# Altium footprint library ASM001-design.PcbLib: 42 footprints (part 1 of 3)
Each footprint in its own frame and in the unit in brackets; x right, y up, seen from the top. Pads: shape width x height; smd on the part's side, far side on the other; paste and mask are expansions set on the pad; w line width, h text height; cw(c..) or ccw(c..) is an arc to the next point about the centre after c.
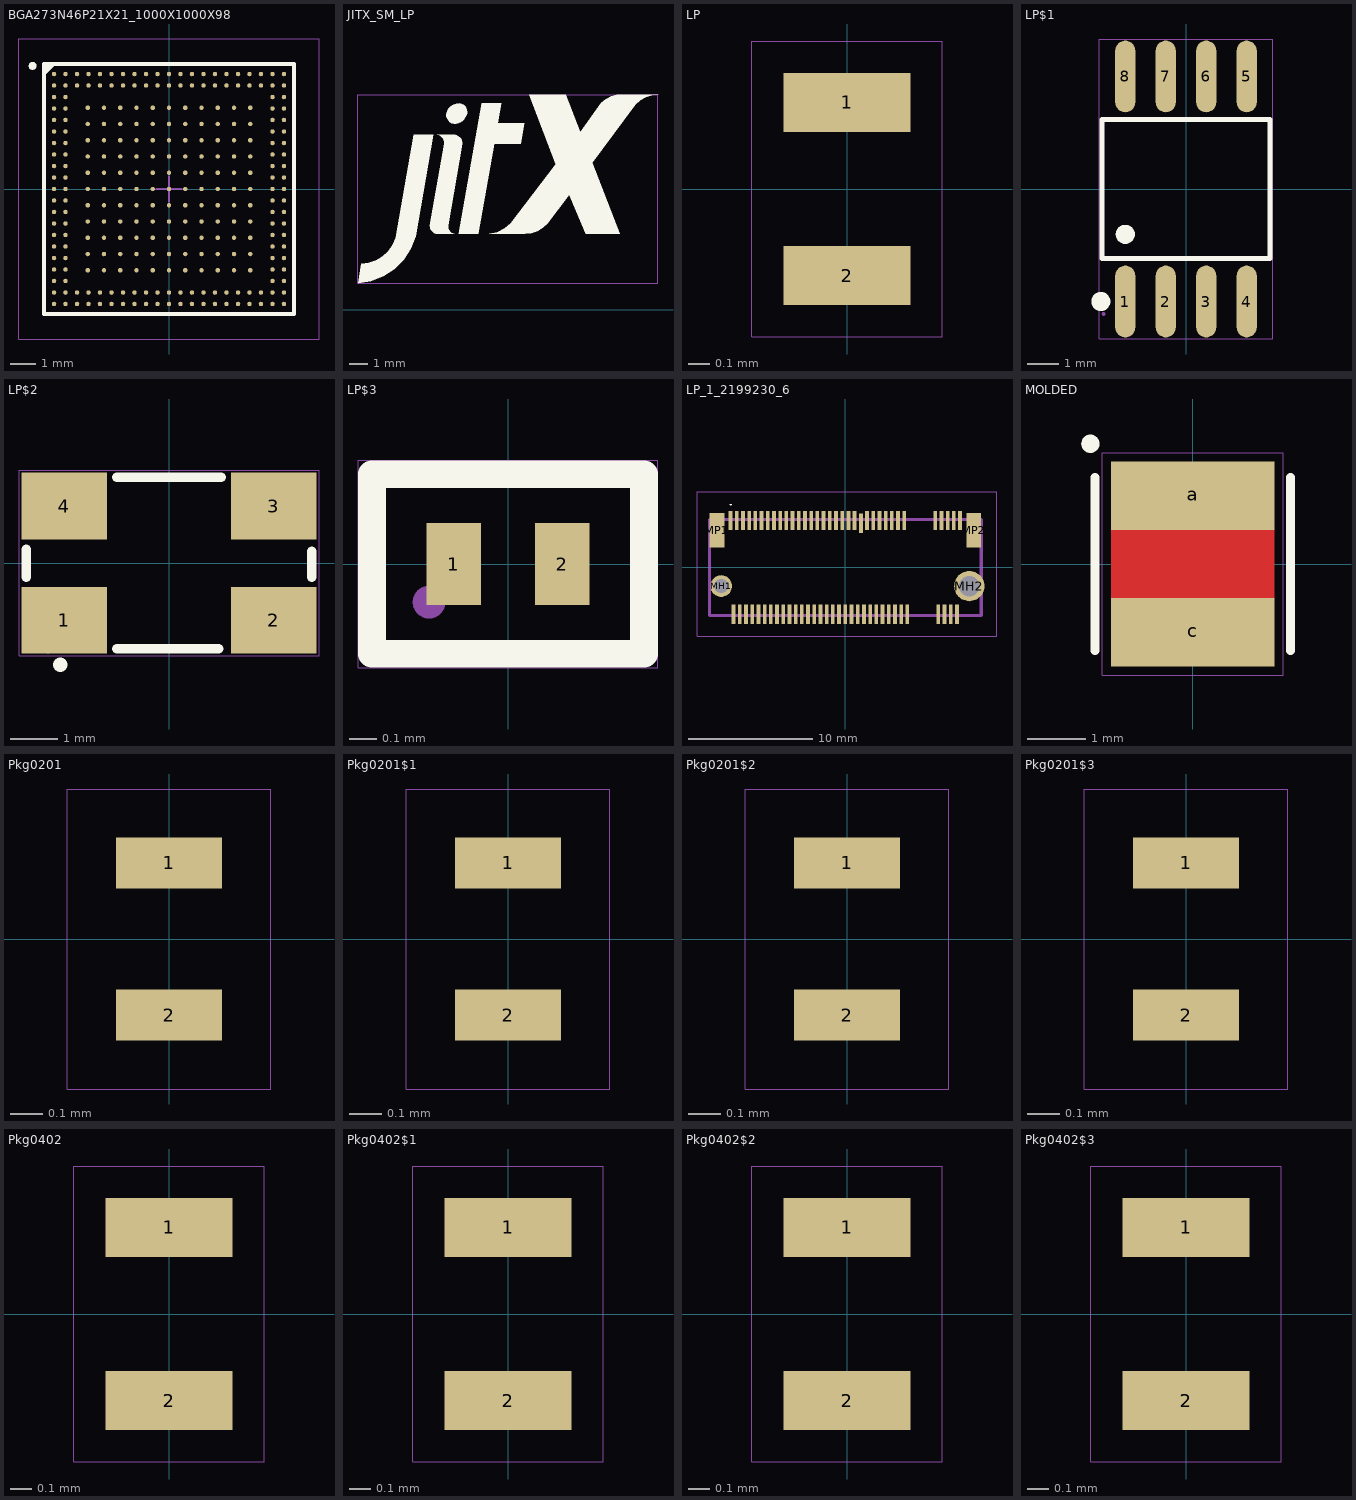
[diagram p0: the footprints below, top view; thin cyan lines are the x and y axes]

## BGA273N46P21X21_1000X1000X98 [mm] "BGA273N46P21X21_1000X1000X98"
height 1
pads (273):
  round 0.18 smd: A1(-4.6,4.6) A2(-4.14,4.6) A3(-3.68,4.6) A4(-3.22,4.6) A5(-2.76,4.6) A6(-2.3,4.6) A7(-1.84,4.6) A8(-1.38,4.6) A9(-0.92,4.6) A10(-0.46,4.6) A11(0,4.6) A12(0.46,4.6) A13(0.92,4.6) A14(1.38,4.6) A15(1.84,4.6) A16(2.3,4.6) A17(2.76,4.6) A18(3.22,4.6) A19(3.68,4.6) A20(4.14,4.6) A21(4.6,4.6) AA1(-4.6,-4.6) AA2(-4.14,-4.6) AA3(-3.68,-4.6) AA4(-3.22,-4.6) AA5(-2.76,-4.6) AA6(-2.3,-4.6) AA7(-1.84,-4.6) AA8(-1.38,-4.6) AA9(-0.92,-4.6) AA10(-0.46,-4.6) AA11(0,-4.6) AA12(0.46,-4.6) AA13(0.92,-4.6) AA14(1.38,-4.6) AA15(1.84,-4.6) AA16(2.3,-4.6) AA17(2.76,-4.6) AA18(3.22,-4.6) AA19(3.68,-4.6) AA20(4.14,-4.6) AA21(4.6,-4.6) B1(-4.6,4.14) B2(-4.14,4.14) B3(-3.68,4.14) B4(-3.22,4.14) B5(-2.76,4.14) B6(-2.3,4.14) B7(-1.84,4.14) B8(-1.38,4.14) B9(-0.92,4.14) B10(-0.46,4.14) B11(0,4.14) B12(0.46,4.14) B13(0.92,4.14) B14(1.38,4.14) B15(1.84,4.14) B16(2.3,4.14) B17(2.76,4.14) B18(3.22,4.14) B19(3.68,4.14) B20(4.14,4.14) B21(4.6,4.14) C1(-4.6,3.68) C2(-4.14,3.68) C20(4.14,3.68) C21(4.6,3.68) D1(-4.6,3.22) D2(-4.14,3.22) D4(-3.25,3.25) D5(-2.6,3.25) D6(-1.95,3.25) D8(-1.3,3.25) D9(-0.65,3.25) D11(0,3.25) D13(0.65,3.25) D14(1.3,3.25) D16(1.95,3.25) D17(2.6,3.25) D18(3.25,3.25) D20(4.14,3.22) D21(4.6,3.22) E1(-4.6,2.76) E2(-4.14,2.76) E4(-3.25,2.6) E5(-2.6,2.6) E6(-1.95,2.6) E8(-1.3,2.6) E9(-0.65,2.6) E11(0,2.6) E13(0.65,2.6) E14(1.3,2.6) E16(1.95,2.6) E17(2.6,2.6) E18(3.25,2.6) E20(4.14,2.76) E21(4.6,2.76) F1(-4.6,2.3) F2(-4.14,2.3) F4(-3.25,1.95) F5(-2.6,1.95) F6(-1.95,1.95) F8(-1.3,1.95) F9(-0.65,1.95) F11(0,1.95) F13(0.65,1.95) F14(1.3,1.95) F16(1.95,1.95) F17(2.6,1.95) F18(3.25,1.95) F20(4.14,2.3) F21(4.6,2.3) G1(-4.6,1.84) G2(-4.14,1.84) G20(4.14,1.84) G21(4.6,1.84) H1(-4.6,1.38) H2(-4.14,1.38) H4(-3.25,1.3) H5(-2.6,1.3) H6(-1.95,1.3) H8(-1.3,1.3) H9(-0.65,1.3) H11(0,1.3) H13(0.65,1.3) H14(1.3,1.3) H16(1.95,1.3) H17(2.6,1.3) H18(3.25,1.3) H20(4.14,1.38) H21(4.6,1.38) J1(-4.6,0.92) J2(-4.14,0.92) J4(-3.25,0.65) J5(-2.6,0.65) J6(-1.95,0.65) J8(-1.3,0.65) J9(-0.65,0.65) J11(0,0.65) J13(0.65,0.65) J14(1.3,0.65) J16(1.95,0.65) J17(2.6,0.65) J18(3.25,0.65) J20(4.14,0.92) J21(4.6,0.92) K1(-4.6,0.46) K2(-4.14,0.46) K20(4.14,0.46) K21(4.6,0.46) L1(-4.6,0) L2(-4.14,0) L4(-3.25,0) L5(-2.6,0) L6(-1.95,0) L8(-1.3,0) L9(-0.65,0) L11(0,0) L13(0.65,0) L14(1.3,0) L16(1.95,0) L17(2.6,0) L18(3.25,0) L20(4.14,0) L21(4.6,0) M1(-4.6,-0.46) M2(-4.14,-0.46) M20(4.14,-0.46) M21(4.6,-0.46) N1(-4.6,-0.92) N2(-4.14,-0.92) N4(-3.25,-0.65) N5(-2.6,-0.65) N6(-1.95,-0.65) N8(-1.3,-0.65) N9(-0.65,-0.65) N11(0,-0.65) N13(0.65,-0.65) N14(1.3,-0.65) N16(1.95,-0.65) N17(2.6,-0.65) N18(3.25,-0.65) N20(4.14,-0.92) N21(4.6,-0.92) P1(-4.6,-1.38) P2(-4.14,-1.38) P4(-3.25,-1.3) P5(-2.6,-1.3) P6(-1.95,-1.3) P8(-1.3,-1.3) P9(-0.65,-1.3) P11(0,-1.3) P13(0.65,-1.3) P14(1.3,-1.3) P16(1.95,-1.3) P17(2.6,-1.3) P18(3.25,-1.3) P20(4.14,-1.38) P21(4.6,-1.38) R1(-4.6,-1.84) R2(-4.14,-1.84) R20(4.14,-1.84) R21(4.6,-1.84) T1(-4.6,-2.3) T2(-4.14,-2.3) T4(-3.25,-1.95) T5(-2.6,-1.95) T6(-1.95,-1.95) T8(-1.3,-1.95) T9(-0.65,-1.95) T11(0,-1.95) T13(0.65,-1.95) T14(1.3,-1.95) T16(1.95,-1.95) T17(2.6,-1.95) T18(3.25,-1.95) T20(4.14,-2.3) T21(4.6,-2.3) U1(-4.6,-2.76) U2(-4.14,-2.76) U4(-3.25,-2.6) U5(-2.6,-2.6) U6(-1.95,-2.6) U8(-1.3,-2.6) U9(-0.65,-2.6) U11(0,-2.6) U13(0.65,-2.6) U14(1.3,-2.6) U16(1.95,-2.6) U17(2.6,-2.6) U18(3.25,-2.6) U20(4.14,-2.76) U21(4.6,-2.76) V1(-4.6,-3.22) V2(-4.14,-3.22) V4(-3.25,-3.25) V5(-2.6,-3.25) V6(-1.95,-3.25) V8(-1.3,-3.25) V9(-0.65,-3.25) V11(0,-3.25) V13(0.65,-3.25) V14(1.3,-3.25) V16(1.95,-3.25) V17(2.6,-3.25) V18(3.25,-3.25) V20(4.14,-3.22) V21(4.6,-3.22) W1(-4.6,-3.68) W2(-4.14,-3.68) W20(4.14,-3.68) W21(4.6,-3.68) Y1(-4.6,-4.14) Y2(-4.14,-4.14) Y3(-3.68,-4.14) Y4(-3.22,-4.14) Y5(-2.76,-4.14) Y6(-2.3,-4.14) Y7(-1.84,-4.14) Y8(-1.38,-4.14) Y9(-0.92,-4.14) Y10(-0.46,-4.14) Y11(0,-4.14) Y12(0.46,-4.14) Y13(0.92,-4.14) Y14(1.38,-4.14) Y15(1.84,-4.14) Y16(2.3,-4.14) Y17(2.76,-4.14) Y18(3.22,-4.14) Y19(3.68,-4.14) Y20(4.14,-4.14) Y21(4.6,-4.14)
Top Overlay:
  region: -5,4.523 -5,5 -4.523,5
  region: -5.306,4.894 -5.303,4.923 -5.306,4.953 -5.315,4.982 -5.329,5.009 -5.348,5.032 -5.371,5.051 -5.397,5.065 -5.426,5.074 -5.456,5.076 -5.486,5.074 -5.515,5.065 -5.541,5.051 -5.564,5.032 -5.583,5.009 -5.597,4.982 -5.606,4.953 -5.609,4.923 -5.606,4.894 -5.597,4.865 -5.583,4.838 -5.564,4.815 -5.541,4.796 -5.515,4.782 -5.486,4.773 -5.456,4.77 -5.426,4.773 -5.397,4.782 -5.371,4.796 -5.348,4.815 -5.329,4.838 -5.315,4.865
  lines w0.153: -5,-5 -5,5 5,5 5,-5 -5,-5
Mechanical 1:
  lines w0.1: -0.5,0 0.5,0 ; 0,-0.5 0,0.5
Mechanical 3:
  lines w0.001: -6,-6 -6,6 6,6 6,-6 -6,-6

## JITX_SM_LP [mm] "JITX_SM_LP"
height 1
Top Overlay:
  region: 11.721,4.556 12.885,6.093 14.112,7.766 13.481,9.389 12.708,11.379 10.78,11.38 12.165,7.687 9.802,4.569 9.471,4.293 9.084,4.102 8.664,4.005 10.545,4.005 10.878,4.041 11.195,4.149 11.481,4.323
  region: 5.903,4.007 6.809,4.009 6.722,4.032 6.643,4.074 6.574,4.133 6.521,4.205 6.485,4.288 6.468,4.376 6.472,4.466 7.218,8.777 7.218,8.873 7.197,8.966 7.156,9.052 7.096,9.128 7.022,9.188 6.936,9.23 6.842,9.251 5.904,9.249 5.994,9.227 6.076,9.185 6.148,9.126 6.204,9.053 6.243,8.969 6.263,8.879 6.262,8.787 5.511,4.426 5.516,4.347 5.536,4.27 5.572,4.198 5.62,4.135 5.68,4.083 5.749,4.043 5.824,4.017
  region: 4.754,3.874 5.698,9.252 4.649,9.252 3.69,3.807 3.536,3.432 3.305,3.097 3.009,2.819 2.662,2.609 2.277,2.478 1.874,2.43 1.7,1.384 2.388,1.505 3.037,1.763 3.62,2.147 4.114,2.641 4.497,3.225
  region: 7.052,10.921 6.897,10.903 6.751,10.85 6.621,10.765 6.513,10.653 6.434,10.519 6.4,10.431 6.384,10.338 6.387,10.244 6.407,10.152 6.446,10.066 6.5,9.989 6.568,9.924 6.648,9.874 6.769,9.847 6.893,9.845 7.015,9.868 7.13,9.915 7.234,9.984 7.321,10.073 7.389,10.177 7.444,10.268 7.476,10.369 7.485,10.474 7.471,10.579 7.434,10.679 7.375,10.767 7.298,10.84 7.18,10.895
  region: 8.248,10.921 7.031,4.004 8.08,4.004 8.922,8.789 10.312,8.791 10.5,9.871 9.113,9.872 9.296,10.921
  region: 13.481,9.389 14.112,7.766 16.394,10.845 16.641,11.075 16.931,11.247 17.252,11.352 17.588,11.384 15.733,11.382 15.415,11.369 15.107,11.291 14.822,11.15 14.572,10.953
  region: 13.76,4.004 12.885,6.093 14.112,7.766 15.573,4.005
Mechanical 3:
  lines w0.001: 1.7,1.384 1.7,11.384 17.588,11.384 17.588,1.384 1.7,1.384

## LP [mm] "LP"
height 1
pads (2):
  rect 0.6x0.28 smd: 1(0,0.41) 2(0,-0.41)
Mechanical 3:
  lines w0.001: -0.45,-0.7 -0.45,0.7 0.45,0.7 0.45,-0.7 -0.45,-0.7
3D body "jitx-64d1eb60b789d8dc4b8da161.stp": height 0, standoff 0, extent -0.25,-0.5 0.25,0.5

## LP$1 [mm] "LP$1"
height 1
pads (8):
  oval 0.63x2.25 smd: 1(-1.905,-3.53) 2(-0.635,-3.53) 3(0.635,-3.53) 4(1.905,-3.53) 5(1.905,3.531) 6(0.635,3.531) 7(-0.635,3.531) 8(-1.905,3.531)
Top Overlay:
  lines w0.152: -2.639,-2.176 2.639,-2.176 2.639,2.177 -2.639,2.177 -2.639,-2.176
  lines w0.3: -2.822,-3.53 -2.819,-3.501 -2.811,-3.473 -2.797,-3.447 -2.778,-3.424 -2.755,-3.405 -2.729,-3.391 -2.701,-3.383 -2.672,-3.38 -2.643,-3.383 -2.615,-3.391 -2.589,-3.405 -2.566,-3.424 -2.547,-3.447 -2.533,-3.473 -2.525,-3.501 -2.522,-3.53 -2.525,-3.559 -2.533,-3.587 -2.547,-3.613 -2.566,-3.636 -2.589,-3.655 -2.615,-3.669 -2.643,-3.677 -2.672,-3.68 -2.701,-3.677 -2.729,-3.669 -2.755,-3.655 -2.778,-3.636 -2.797,-3.613 -2.811,-3.587 -2.819,-3.559 -2.822,-3.53 ; -2.055,-1.423 -2.052,-1.394 -2.044,-1.366 -2.03,-1.34 -2.011,-1.317 -1.988,-1.298 -1.962,-1.284 -1.934,-1.276 -1.905,-1.273 -1.876,-1.276 -1.848,-1.284 -1.822,-1.298 -1.799,-1.317 -1.78,-1.34 -1.766,-1.366 -1.758,-1.394 -1.755,-1.423 -1.758,-1.452 -1.766,-1.48 -1.78,-1.506 -1.799,-1.529 -1.822,-1.548 -1.848,-1.562 -1.876,-1.57 -1.905,-1.573 -1.934,-1.57 -1.962,-1.562 -1.988,-1.548 -2.011,-1.529 -2.03,-1.506 -2.044,-1.48 -2.052,-1.452 -2.055,-1.423
Mechanical 1:
  lines w0.06: -2.614,-3.926 -2.615,-3.92 -2.614,-3.914 -2.613,-3.909 -2.61,-3.903 -2.606,-3.899 -2.602,-3.895 -2.596,-3.892 -2.591,-3.891 -2.585,-3.89 -2.579,-3.891 -2.574,-3.892 -2.568,-3.895 -2.564,-3.899 -2.56,-3.903 -2.557,-3.909 -2.556,-3.914 -2.555,-3.92 -2.556,-3.926 -2.557,-3.931 -2.56,-3.937 -2.564,-3.941 -2.568,-3.945 -2.574,-3.948 -2.579,-3.949 -2.585,-3.95 -2.591,-3.949 -2.596,-3.948 -2.602,-3.945 -2.606,-3.941 -2.61,-3.937 -2.613,-3.931 -2.614,-3.926
  lines w0.3: -2.055,-4.35 -2.052,-4.321 -2.044,-4.293 -2.03,-4.267 -2.011,-4.244 -1.988,-4.225 -1.962,-4.211 -1.934,-4.203 -1.905,-4.2 -1.876,-4.203 -1.848,-4.211 -1.822,-4.225 -1.799,-4.244 -1.78,-4.267 -1.766,-4.293 -1.758,-4.321 -1.755,-4.35 -1.758,-4.379 -1.766,-4.407 -1.78,-4.433 -1.799,-4.456 -1.822,-4.475 -1.848,-4.489 -1.876,-4.497 -1.905,-4.5 -1.934,-4.497 -1.962,-4.489 -1.988,-4.475 -2.011,-4.456 -2.03,-4.433 -2.044,-4.407 -2.052,-4.379 -2.055,-4.35
Mechanical 3:
  lines w0.001: -2.715,-4.706 -2.715,4.706 2.715,4.706 2.715,-4.706 -2.715,-4.706
3D body "jitx-64d18a78b789d8dc4b82e2c6.stp": height 0, standoff 0, extent -2.65,-3.953 2.65,3.953

## LP$2 [mm] "LP$2"
height 1
pads (4):
  rect 1.8x1.4 smd: 1(-2.2,-1.2) 2(2.2,-1.2) 3(2.2,1.199) 4(-2.2,1.199)
Top Overlay:
  lines w0.2: -3,-0.296 -3,0.295 ; -1.096,-1.801 1.045,-1.801 ; -1.096,1.8 1.096,1.8 ; 3,-0.296 3,0.253
  lines w0.3: -2.287,-2.137 -2.285,-2.137
Mechanical 1:
  lines w0.06: -3.03,-1.801 -3.029,-1.795 -3.028,-1.79 -3.025,-1.784 -3.021,-1.78 -3.017,-1.776 -3.011,-1.773 -3.006,-1.772 -3,-1.771 -2.994,-1.772 -2.989,-1.773 -2.983,-1.776 -2.979,-1.78 -2.975,-1.784 -2.972,-1.79 -2.971,-1.795 -2.97,-1.801 -2.971,-1.807 -2.972,-1.812 -2.975,-1.818 -2.979,-1.822 -2.983,-1.826 -2.989,-1.829 -2.994,-1.83 -3,-1.831 -3.006,-1.83 -3.011,-1.829 -3.017,-1.826 -3.021,-1.822 -3.025,-1.818 -3.028,-1.812 -3.029,-1.807 -3.03,-1.801
  lines w0.5: -2.79,-1.398 -2.785,-1.349 -2.771,-1.302 -2.748,-1.259 -2.717,-1.221 -2.679,-1.19 -2.636,-1.167 -2.589,-1.153 -2.54,-1.148 -2.491,-1.153 -2.444,-1.167 -2.401,-1.19 -2.363,-1.221 -2.332,-1.259 -2.309,-1.302 -2.295,-1.349 -2.29,-1.398 -2.295,-1.447 -2.309,-1.494 -2.332,-1.537 -2.363,-1.575 -2.401,-1.606 -2.444,-1.629 -2.491,-1.643 -2.54,-1.648 -2.589,-1.643 -2.636,-1.629 -2.679,-1.606 -2.717,-1.575 -2.748,-1.537 -2.771,-1.494 -2.785,-1.447 -2.79,-1.398
Mechanical 3:
  lines w0.001: -3.151,-1.95 -3.151,1.95 3.151,1.95 3.151,-1.95 -3.151,-1.95
3D body "jitx-64d254f9b789d8dc4b996f8d.stp": height 0, standoff 0, extent -3,-1.8 3,1.8

## LP$3 [mm] "LP$3"
height 1
pads (2):
  rect 0.2x0.3 smd: 1(-0.2,0) 2(0.2,0)
Top Overlay:
  lines w0.102: -0.5,-0.33 0.5,-0.33 0.5,0.33 -0.5,0.33 -0.5,-0.33
Mechanical 1:
  lines w0.06: -0.319,-0.146 -0.32,-0.14 -0.319,-0.134 -0.318,-0.129 -0.315,-0.123 -0.311,-0.119 -0.307,-0.115 -0.301,-0.112 -0.296,-0.111 -0.29,-0.11 -0.284,-0.111 -0.279,-0.112 -0.273,-0.115 -0.269,-0.119 -0.265,-0.123 -0.262,-0.129 -0.261,-0.134 -0.26,-0.14 -0.261,-0.146 -0.262,-0.151 -0.265,-0.157 -0.269,-0.161 -0.273,-0.165 -0.279,-0.168 -0.284,-0.169 -0.29,-0.17 -0.296,-0.169 -0.301,-0.168 -0.307,-0.165 -0.311,-0.161 -0.315,-0.157 -0.318,-0.151 -0.319,-0.146
Mechanical 3:
  lines w0.001: -0.551,-0.381 -0.551,0.381 0.551,0.381 0.551,-0.381 -0.551,-0.381
3D body "jitx-64d141cdb789d8dc4b7a4f70.stp": height 0, standoff 0, extent -0.29,-0.14 0.29,0.14

## LP_1_2199230_6 [mm] "LP_1_2199230_6"
height 1
pads (71):
  rect 0.3x1.55 smd: 1(-9.25,3.775) 2(-9,-3.775) 3(-8.75,3.775) 4(-8.5,-3.775) 5(-8.25,3.775) 6(-8,-3.775) 7(-7.75,3.775) 8(-7.5,-3.775) 9(-7.25,3.775) 10(-7,-3.775) 11(-6.75,3.775) 12(-6.5,-3.775) 13(-6.25,3.775) 14(-6,-3.775) 15(-5.75,3.775) 16(-5.5,-3.775) 17(-5.25,3.775) 18(-5,-3.775) 19(-4.75,3.775) 20(-4.5,-3.775) 21(-4.25,3.775) 22(-4,-3.775) 23(-3.75,3.775) 24(-3.5,-3.775) 25(-3.25,3.775) 26(-3,-3.775) 27(-2.75,3.775) 28(-2.5,-3.775) 29(-2.25,3.775) 30(-2,-3.775) 31(-1.75,3.775) 32(-1.5,-3.775) 33(-1.25,3.775) 34(-1,-3.775) 35(-0.75,3.775) 36(-0.5,-3.775) 37(-0.25,3.775) 38(0,-3.775) 39(0.25,3.775) 40(0.5,-3.775) 41(0.75,3.775) 42(1,-3.775) 43(1.27,3.556) 44(1.5,-3.775) 45(1.75,3.775) 46(2,-3.775) 47(2.25,3.775) 48(2.5,-3.775) 49(2.75,3.775) 50(3,-3.775) 51(3.25,3.775) 52(3.5,-3.775) 53(3.75,3.775) 54(4,-3.775) 55(4.25,3.775) 56(4.5,-3.775) 57(4.75,3.775) 58(5,-3.775) 67(7.25,3.775) 68(7.5,-3.775) 69(7.75,3.775) 70(8,-3.775) 71(8.25,3.775) 72(8.5,-3.775) 73(8.75,3.775) 74(9,-3.775) 75(9.25,3.775)
  round 1.75 hole 1.15: MH1(-10,-1.5)
  round 2.45 hole 1.65: MH2(10,-1.5)
  rect 1.2x2.75 smd: MP1(-10.35,3) MP2(10.35,3)
Top Overlay:
  lines w0.072: -9.269,5.061 -9.267,5.054 -9.264,5.048 -9.259,5.043 -9.254,5.038 -9.248,5.035 -9.241,5.033 -9.234,5.032 -9.227,5.033 -9.22,5.035 -9.214,5.038 -9.209,5.043 -9.204,5.048 -9.201,5.054 -9.199,5.061 -9.198,5.068 -9.199,5.075 -9.201,5.082 -9.204,5.088 -9.209,5.093 -9.214,5.098 -9.22,5.101 -9.227,5.103 -9.234,5.104 -9.241,5.103 -9.248,5.101 -9.254,5.098 -9.259,5.093 -9.264,5.088 -9.267,5.082 -9.269,5.075 -9.27,5.068 -9.269,5.061
Mechanical 1:
  lines w0.1: -11.95,-5.55 12.225,-5.55 12.225,6.104 -11.95,6.104 -11.95,-5.55
  lines w0.254: -10.95,-3.875 10.95,-3.875 10.95,3.875 -10.95,3.875 -10.95,-3.875

## MOLDED [mm] "MOLDED"
height 1
pads (2):
  rect 2.79x1.167 smd: a(0,1.166) c(0,-1.166)
Top Layer:
  pour cut-out: -1.395,0.583 -1.395,-0.583 1.395,-0.583 1.395,0.583
Top Overlay:
  region: -1.598,2.023 -1.595,2.053 -1.598,2.083 -1.607,2.112 -1.621,2.138 -1.64,2.161 -1.663,2.18 -1.689,2.194 -1.718,2.203 -1.748,2.206 -1.778,2.203 -1.807,2.194 -1.833,2.18 -1.856,2.161 -1.875,2.138 -1.889,2.112 -1.898,2.083 -1.901,2.053 -1.898,2.023 -1.889,1.994 -1.875,1.968 -1.856,1.945 -1.833,1.926 -1.807,1.912 -1.778,1.903 -1.748,1.9 -1.718,1.903 -1.689,1.912 -1.663,1.926 -1.64,1.945 -1.621,1.968 -1.607,1.994
  lines w0.153: -1.671,-1.476 -1.671,1.476 ; 1.671,-1.476 1.671,1.476
Mechanical 1:
  lines w0.1: -0.5,0 0.5,0 ; 0,-0.5 0,0.5
Mechanical 3:
  lines w0.001: -1.545,-1.9 -1.545,1.9 1.545,1.9 1.545,-1.9 -1.545,-1.9

## Pkg0201 [mm] "Pkg0201"
height 1
pads (2):
  rect 0.33x0.158 smd: 1(0,0.236) 2(0,-0.236)
Mechanical 3:
  lines w0.001: -0.315,-0.465 -0.315,0.465 0.315,0.465 0.315,-0.465 -0.315,-0.465
3D body "jitx-64d243b0b789d8dc4b978a0b.stp": height 0, standoff 0, extent -0.15,-0.3 0.15,0.3

## Pkg0201$1 [mm] "Pkg0201$1"
height 1
pads (2):
  rect 0.33x0.158 smd: 1(0,0.236) 2(0,-0.236)
Mechanical 3:
  lines w0.001: -0.315,-0.465 -0.315,0.465 0.315,0.465 0.315,-0.465 -0.315,-0.465

## Pkg0201$2 [mm] "Pkg0201$2"
height 1
pads (2):
  rect 0.33x0.158 smd: 1(0,0.236) 2(0,-0.236)
Mechanical 3:
  lines w0.001: -0.315,-0.465 -0.315,0.465 0.315,0.465 0.315,-0.465 -0.315,-0.465

## Pkg0201$3 [mm] "Pkg0201$3"
height 1
pads (2):
  rect 0.33x0.158 smd: 1(0,0.236) 2(0,-0.236)
Mechanical 3:
  lines w0.001: -0.315,-0.465 0.315,-0.465 0.315,0.465 -0.315,0.465 -0.315,-0.465
3D body "jitx-64d243b0b789d8dc4b978a0b.stp": height 0, standoff 0, extent -0.15,-0.3 0.15,0.3

## Pkg0402 [mm] "Pkg0402"
height 1
pads (2):
  rect 0.6x0.28 smd: 1(0,0.41) 2(0,-0.41)
Mechanical 3:
  lines w0.001: -0.45,-0.7 -0.45,0.7 0.45,0.7 0.45,-0.7 -0.45,-0.7

## Pkg0402$1 [mm] "Pkg0402$1"
height 1
pads (2):
  rect 0.6x0.28 smd: 1(0,0.41) 2(0,-0.41)
Mechanical 3:
  lines w0.001: -0.45,-0.7 -0.45,0.7 0.45,0.7 0.45,-0.7 -0.45,-0.7
3D body "jitx-64d1eb60b789d8dc4b8da161.stp": height 0, standoff 0, extent -0.25,-0.5 0.25,0.5

## Pkg0402$2 [mm] "Pkg0402$2"
height 1
pads (2):
  rect 0.6x0.28 smd: 1(0,0.41) 2(0,-0.41)
Mechanical 3:
  lines w0.001: -0.45,-0.7 -0.45,0.7 0.45,0.7 0.45,-0.7 -0.45,-0.7
3D body "jitx-64d1eb60b789d8dc4b8da161.stp": height 0, standoff 0, extent -0.25,-0.5 0.25,0.5

## Pkg0402$3 [mm] "Pkg0402$3"
height 1
pads (2):
  rect 0.6x0.28 smd: 1(0,0.41) 2(0,-0.41)
Mechanical 3:
  lines w0.001: -0.45,-0.7 -0.45,0.7 0.45,0.7 0.45,-0.7 -0.45,-0.7